# Altium footprint library USBConnectors.PCBLIB: 18 footprints (part 1 of 2)
Each footprint in its own frame and in the unit in brackets; x right, y up, seen from the top. Pads: shape width x height; smd on the part's side, far side on the other; paste and mask are expansions set on the pad; w line width, h text height; cw(c..) or ccw(c..) is an arc to the next point about the centre after c.
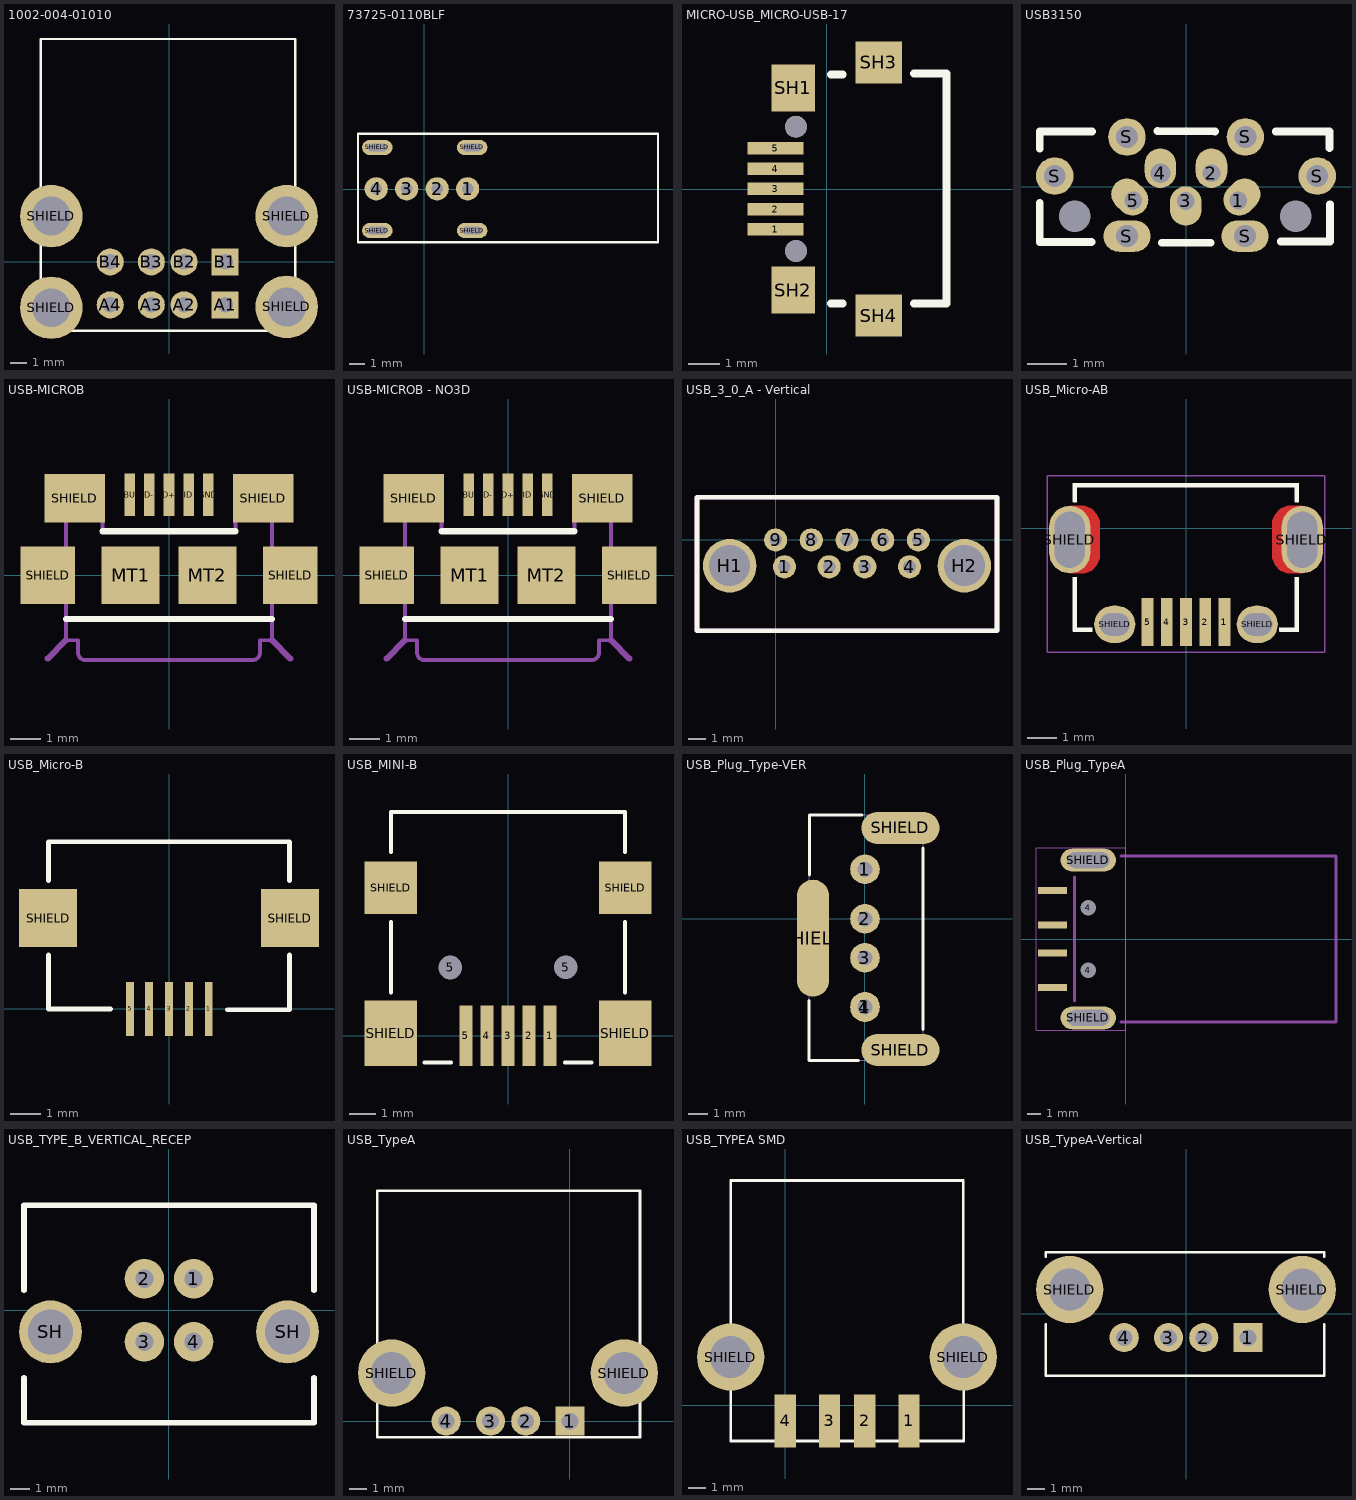
[diagram p0: the footprints below, top view; thin cyan lines are the x and y axes]

## 1002-004-01010 [mil]
pads (12):
  rect 65x65 hole 37: A1(134.5,-103) B1(134.5,0)
  round 65 hole 37: A2(36,-103) A3(-42.5,-103) A4(-141.1,-103) B2(36,0) B3(-42.5,0) B4(-141.1,0)
  round 150 hole 93: SHIELD(-282.5,-110) SHIELD(-282.5,110) SHIELD(282.5,-108) SHIELD(282.5,110)
Top Overlay:
  lines w5.91: -307.5,-165 302.5,-165 302.5,535 -307.5,535 -307.5,-165
3D body "1002-004-01010.step": height 636.33, standoff -158.95, extent -306.28,-163.81 299.61,535.01

## 73725-0110BLF [mil]
pads (8):
  round 60 hole 30: 1(112.22,0.5) 2(33.48,0.5) 3(-45.26,0.5) 4(-124,0.5)
  oval 78.74x39.37 hole 19.68 slot 49.21 at 0 deg: SHIELD(-121,-107.5) SHIELD(-121,107.5) SHIELD(124,-107.5) SHIELD(124,107.5)
Top Overlay:
  lines w5.91: -171,-137.5 604,-137.5 604,142.5 -171,142.5 -171,-137.5
3D body "73725-0110blfc.stp": height 572.47, standoff -128.93, extent -171.37,-140.17 604.22,140.49

## MICRO-USB_MICRO-USB-17 [mm]
pads (11):
  rect 1.8x0.4 smd: 1(-1.661,-1.297) 2(-1.661,-0.646) 3(-1.661,0.004) 4(-1.661,0.654) 5(-1.661,1.304)
  rect 1.4x1.5 smd: SH1(-1.08,3.25) SH2(-1.08,-3.25)
  rect 1.5x1.35 smd: SH3(1.661,4.075) SH4(1.661,-4.075)
  round 0.7 hole 0.7 unplated: ""(-0.999,-1.994) ""(-0.999,2.004)
Top Overlay:
  lines w0.254: 0.127,-3.683 0.508,-3.683 ; 0.127,3.683 0.508,3.683 ; 2.794,-3.685 3.85,-3.685 3.85,3.715 2.794,3.715
3D body "629105136821_Download_STP_629105136821_rev1.stp": height 2.71, standoff -0.59, extent -1.626,-4 4.278,4

## USB3150 [mm]
pads (13):
  oval 0.8x1 hole 0.45 copper offset 0.09,0.09 rot 135: 1(1.325,-0.355)
  oval 0.8x1 hole 0.45 copper offset 0,0.127: 2(0.645,0.338)
  oval 0.8x1 hole 0.45 copper offset 0,-0.127: 3(-0.005,-0.365)
  oval 0.8x1 hole 0.5 copper offset 0,0.127: 4(-0.648,0.338)
  oval 0.8x1 hole 0.45 copper offset -0.09,0.09 rot 45: 5(-1.335,-0.355)
  round 0 hole 0.8: MT1(-2.815,-0.755) MT2(2.785,-0.755)
  round 0.95 hole 0.55: S(-3.325,0.265) S(-1.495,1.255) S(1.505,1.255) S(3.325,0.265)
  oval 1.2x0.8 hole 0.55: S(-1.495,-1.255) S(1.495,-1.255)
Top Overlay:
  lines w0.2: -3.705,-0.415 -3.705,-1.405 -2.395,-1.405 ; -3.705,0.965 -3.705,1.395 -2.385,1.395 ; -0.724,1.405 0.735,1.395 ; -0.615,-1.425 0.625,-1.425 ; 2.273,1.395 3.635,1.395 3.635,0.973 ; 2.4,-1.395 3.645,-1.395 3.645,-0.45
3D body "usb3150.step": height 7.14, standoff -1.29, extent -3.688,-1.415 3.662,1.385

## USB-MICROB [mm]
pads (11):
  rect 0.35x1.4 smd: D+(0,2.65) D-(-0.65,2.65) GND(1.3,2.65) ID(0.65,2.65) VBUS(-1.3,2.65)
  rect 1.9x1.9 smd: MT1(-1.27,0) MT2(1.27,0)
  rect 1.8x1.9 smd: SHIELD(-4,0) SHIELD(4,0)
  rect 2x1.6 smd: SHIELD(-3.111,2.54) SHIELD(3.111,2.54)
Top Overlay:
  lines w0.203: -3.4,-1.45 3.4,-1.45 ; -2.2,1.45 2.2,1.45
Mechanical 16:
  lines w0.127: -3.4,-1.45 3.4,-1.45 ; -3.4,-1.45 -3.4,2.85 -2.2,2.85 -2.2,1.45 2.2,1.45 2.2,2.85 3.4,2.85 3.4,-1.45 ; -3.4,-1.45 -3.4,-2.15 -3,-2.15 -3,-2.55 ccw(c-2.762,-2.565) -2.8,-2.8 2.75,-2.8 ccw(c2.765,-2.563) 3,-2.6 3,-2.15 3.4,-2.15 3.4,-1.45
  lines w0.203: -4,-2.75 -3.4,-2.15 ; 3.4,-2.15 4,-2.75
3D body "User Library-10118192.step": height 2.73, standoff -0.28, extent -3.956,-2.74 3.956,2.921

## USB-MICROB - NO3D [mm]
pads (11):
  rect 0.35x1.4 smd: D+(0,2.65) D-(-0.65,2.65) GND(1.3,2.65) ID(0.65,2.65) VBUS(-1.3,2.65)
  rect 1.9x1.9 smd: MT1(-1.27,0) MT2(1.27,0)
  rect 1.8x1.9 smd: SHIELD(-4,0) SHIELD(4,0)
  rect 2x1.6 smd: SHIELD(-3.111,2.54) SHIELD(3.111,2.54)
Top Overlay:
  lines w0.203: -3.4,-1.45 3.4,-1.45 ; -2.2,1.45 2.2,1.45
Mechanical 16:
  lines w0.127: -3.4,-1.45 -3.4,-2.15 -3,-2.15 -3,-2.55 ccw(c-2.762,-2.565) -2.8,-2.8 2.75,-2.8 ccw(c2.765,-2.563) 3,-2.6 3,-2.15 3.4,-2.15 3.4,-1.45 ; -3.4,-1.45 -3.4,2.85 -2.2,2.85 -2.2,1.45 2.2,1.45 2.2,2.85 3.4,2.85 3.4,-1.45 ; -3.4,-1.45 3.4,-1.45
  lines w0.203: -4,-2.75 -3.4,-2.15 ; 3.4,-2.15 4,-2.75

## USB_3_0_A - Vertical [mm]
pads (11):
  round 1.3 hole 0.7: 1(0.5,-1.5) 2(3,-1.5) 3(5,-1.5) 4(7.5,-1.5) 5(8,0) 6(6,0) 7(4,0) 8(2,0) 9(0,0)
  round 3 hole 2.3: H1(-2.57,-1.44) H2(10.57,-1.44)
Top Overlay:
  lines w0.254: -4.4,-5.09 12.4,-5.09 12.4,2.4 -4.4,2.4 -4.4,-5.09
Mechanical 1:
  lines w0.254: -4.4,-5.09 -4.4,2.4 12.4,2.4 12.4,-5.09 -4.4,-5.09
3D body "10117836.STEP": height 14.8, standoff -4, extent -3.887,-4.91 11.787,2.21

## USB_Micro-AB [mil]
height 153.54
pads (9):
  rect 15.75x64 smd: 1(51.18,-125) 2(25.59,-125) 3(0,-125) 4(-25.59,-125) 5(-51.18,-125)
  oval 55x90 hole 40 slot 75 at 90 deg mask+0: SHIELD(-155,-15) SHIELD(155,-15)
  oval 55x50 hole 30 slot 40 at 0 deg mask+0: SHIELD(-95,-128) SHIELD(95,-128)
Top Layer:
  region: -155,30 -140,30 -135.03,30 -125.84,26.19 -118.81,19.16 -115,9.97 -115,5 -115,-35 -115,-39.97 -118.81,-49.16 -125.84,-56.19 -135.03,-60 -140,-60 -155,-60
  region: 155,-60 140,-60 135.03,-60 125.84,-56.19 118.81,-49.16 115,-39.97 115,-35 115,5 115,9.97 118.81,19.16 125.84,26.19 135.03,30 140,30 155,30
Top Overlay:
  region: -150.5,35.5 -150.5,60.5 150.5,60.5 150.5,35.5 145.5,35.5 145.5,55.5 -145.5,55.5 -145.5,35.5
  region: -150.5,-65 -145.5,-65 -145.5,-132.5 -125,-132.5 -125,-137.5 -150.5,-137.5
  region: 145.5,-65 150.5,-65 150.5,-137.5 125,-137.5 125,-132.5 145.5,-132.5
  lines w1: -150.5,-137.5 -125,-137.5 -125,-132.5 -145.5,-132.5 -145.5,-65 -150.5,-65 -150.5,-137.5 ; -150.5,35.5 -145.5,35.5 -145.5,55.5 145.5,55.5 145.5,35.5 150.5,35.5 150.5,60.5 -150.5,60.5 -150.5,35.5 ; 125,-137.5 150.5,-137.5 150.5,-65 145.5,-65 145.5,-132.5 125,-132.5 125,-137.5
Top Solder:
  region: -155,30 -140,30 -135.03,30 -125.84,26.19 -118.81,19.16 -115,9.97 -115,5 -115,-35 -115,-39.97 -118.81,-49.16 -125.84,-56.19 -135.03,-60 -140,-60 -155,-60
  region: 155,-60 140,-60 135.03,-60 125.84,-56.19 118.81,-49.16 115,-39.97 115,-35 115,5 115,9.97 118.81,19.16 125.84,26.19 135.03,30 140,30 155,30
Mechanical 14:
  lines w2: -185,-165 185,-165 185,70 -185,70 -185,-165
3D body "User Library-MicroUSB-B_Molex_105017-0001.STEP": height 108.07, standoff -21.85, extent -161.42,-134.33 161.42,79.45

## USB_Micro-B [mil]
height 153.54
pads (7):
  rect 10x70 smd: 1(51.18,0) 2(25.59,0) 3(0,0) 4(-25.59,0) 5(-50,0)
  rect 74.8x74.8 smd: SHIELD(-155.51,116.84) SHIELD(155.51,116.84)
Top Overlay:
  lines w6: -155,69.8 -155,0 -75,0 ; -155,164.84 -155,215 155,215 155,164.84 ; 75,-1 155,-1 155,69.8
3D body "Micro USB.STP": height 106.7, standoff -9.04, extent -156.58,4.51 157.59,218.29

## USB_MINI-B [mm]
height 3.9
pads (11):
  rect 0.5x2.3 smd mask+0.025: 1(1.6,0) 2(0.8,0) 3(0,0) 4(-0.8,0) 5(-1.6,0)
  round 0.6 hole 0.9 unplated: 5(-2.2,2.6) 5(2.2,2.6)
  rect 2x2.5 smd mask+0: SHIELD(-4.45,0.1) SHIELD(4.45,0.1)
  rect 2x2 smd mask+0: SHIELD(-4.45,5.631) SHIELD(4.45,5.631)
Top Overlay:
  lines w0.152: -4.445,1.651 -4.445,4.318 ; -4.445,6.985 -4.445,8.509 4.445,8.509 4.445,6.985 ; -3.175,-1.016 -2.159,-1.016 ; 2.159,-1.016 3.175,-1.016 ; 4.445,1.651 4.445,4.318
3D body "User Library-USB_mini_B.STEP": height 3.95, standoff -1, extent -5.35,-0.7 5.35,8.5

## USB_Plug_Type-VER [mil]
height 177.17
pads (8):
  round 60 hole 30: 1(0,-177.74) 1(0,100) 2(0,0) 3(0,-78.74) 4(0,-178.74)
  oval 64.96x236.22 smd: SHIELD(-105,-39)
  oval 157.48x64.96 smd: SHIELD(71.7,-265.15) SHIELD(71.7,183.67)
Top Overlay:
  lines w5.91: -113,-165 -113,-286 -13,-286 ; -112,89 -112,210 -6,210 ; 117,-224 117,143
Mechanical 14:
  lines w2: -113,-285.74 -113,210 118,210 118,-285.74 -113,-285.74
3D body "14381.stp": height 736.72, standoff -62.49, extent -111.16,-287 117.16,209.29

## USB_Plug_TypeA [mm]
height 4.5
pads (8):
  rect 2.1x0.5 smd: 1(-5.3,3.5) 2(-5.3,1) 3(-5.3,-1) 4(-5.3,-3.5)
  round 0.8 hole 1.1 unplated: 4(-2.7,-2.25) 4(-2.7,2.25)
  oval 4x1.65 hole 1.143 slot 3.048 at 0 deg: SHIELD(-2.7,-5.7) SHIELD(-2.7,5.7)
Mechanical 13:
  lines w0.2: -3.7,-4.475 -3.7,4.475 ; -0.33,-6 15.2,-6 15.2,6 -0.33,6
Mechanical 14:
  lines w0.051: -6.477,-6.604 0,-6.604 0,6.604 -6.477,6.604 -6.477,-6.604
3D body "14381.stp": height 3.16, standoff -2.64, extent -5.212,-6.325 15.088,6.281

## USB_TYPE_B_VERTICAL_RECEP [mm]
pads (6):
  round 2 hole 0.92: 1(1.25,1.6) 2(-1.25,1.6) 3(-1.25,-1.6) 4(1.25,-1.6)
  round 3.2 hole 2.3: SH(-6.02,-1.1) SH(6.02,-1.1)
Top Overlay:
  lines w0.3: -7.366,-3.429 -7.366,-5.715 7.366,-5.715 7.366,-3.429 ; -7.366,1.016 -7.366,5.334 7.366,5.334 7.366,1.016
3D body "conector_usb_type_b.stp": height 16.11, standoff -4.2, extent -7.365,-5.805 7.335,5.395

## USB_TypeA [mil]
pads (6):
  rect 65x65 hole 37: 1(0,0)
  round 65 hole 37: 2(-98.5,0) 3(-177,0) 4(-275.6,0)
  round 150 hole 93: SHIELD(-397,107) SHIELD(121,107)
Top Overlay:
  lines w6: -429,-36 -429,139 -429,513 156,513 156,142 156,-36 -429,-36
3D body "M-UE27-AC54-100-REVT1.STEP": height 299.71, standoff -123.39, extent -428.29,-32 156.27,511.31

## USB_TYPEA SMD [mm]
pads (6):
  rect 1.2x3 smd: 1(7,-0.9) 2(4.498,-0.9) 3(2.504,-0.9) 4(0,-0.9)
  round 3.81 hole 2.362: SHIELD(-3.084,2.718) SHIELD(10.074,2.718)
Top Overlay:
  lines w0.152: 10.074,2.718 10.074,12.7 -3.084,12.7 -3.084,2.718 -3.084,-2.032 10.099,-2.032 10.099,2.718
3D body "54-00003.STEP": height 7.51, standoff -4.09, extent -4.32,-1.983 11.28,13.217

## USB_TypeA-Vertical [mil]
pads (6):
  rect 65x65 hole 37: 1(138,-53.5)
  round 65 hole 37: 2(39.5,-53.5) 3(-39,-53.5) 4(-137.6,-53.5)
  round 150 hole 93: SHIELD(-259,53.5) SHIELD(259,53.5)
Top Overlay:
  lines w5.98: -312,126.5 -312,136.5
  lines w6: -312,-23.5 -312,-138.5 308,-138.5 308,-23.5 ; -312,136.5 308,136.5 308,126.5
3D body "usb_ver.step": height 591.05, standoff -153.04, extent -312.82,-141.29 308.82,134.3